# Altium footprint library SIM-Memory_Card Connectors.PcbLib: 17 footprints (part 2 of 2)
Each footprint in its own frame and in the unit in brackets; x right, y up, seen from the top. Pads: shape width x height; smd on the part's side, far side on the other; paste and mask are expansions set on the pad; w line width, h text height; cw(c..) or ccw(c..) is an arc to the next point about the centre after c.
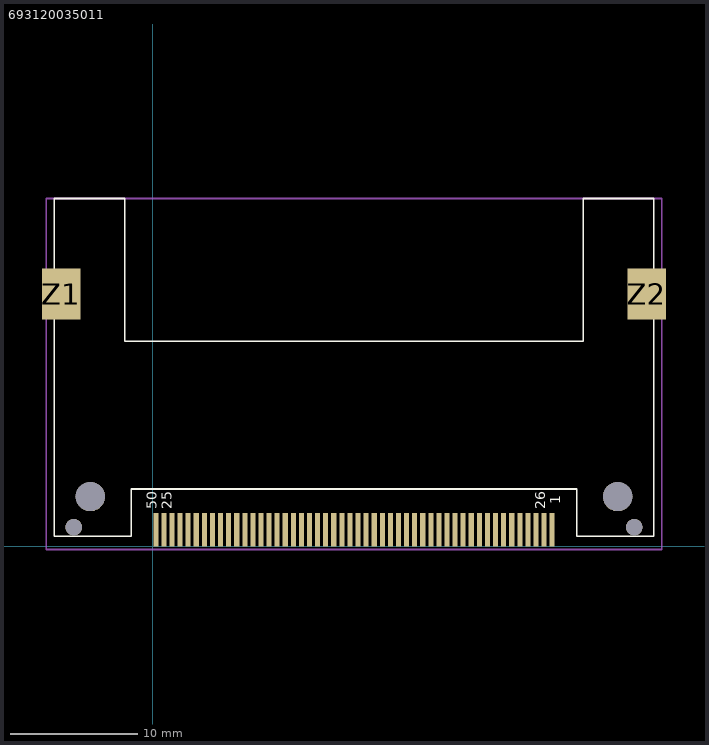
[diagram p1: the footprint, top view; thin cyan lines are the x and y axes]

## 693120035011 [mm] "WR-CRD Compact Flash_Shrouded _50 pins"
height 6.8
pads (56):
  rect 0.4x2.6 smd: 1(31.36,1.3) 2(30.09,1.3) 3(28.82,1.3) 4(27.55,1.3) 5(26.28,1.3) 6(25.01,1.3) 7(23.74,1.3) 8(22.47,1.3) 9(21.2,1.3) 10(19.93,1.3) 11(18.66,1.3) 12(17.39,1.3) 13(16.12,1.3) 14(14.85,1.3) 15(13.58,1.3) 16(12.31,1.3) 17(11.04,1.3) 18(9.77,1.3) 19(8.5,1.3) 20(7.23,1.3) 21(5.96,1.3) 22(4.69,1.3) 23(3.42,1.3) 24(2.15,1.3) 25(0.88,1.3) 26(30.725,1.3) 27(29.455,1.3) 28(28.185,1.3) 29(26.915,1.3) 30(25.645,1.3) 31(24.375,1.3) 32(23.105,1.3) 33(21.835,1.3) 34(20.565,1.3) 35(19.295,1.3) 36(18.025,1.3) 37(16.755,1.3) 38(15.485,1.3) 39(14.215,1.3) 40(12.945,1.3) 41(11.675,1.3) 42(10.405,1.3) 43(9.135,1.3) 44(7.865,1.3) 45(6.595,1.3) 46(5.325,1.3) 47(4.055,1.3) 48(2.785,1.3) 49(1.515,1.3) 50(0.245,1.3)
  rect 3x4 smd: Z1(-7.178,19.8) Z2(38.782,19.8)
  round 1.3 hole 1.3 unplated: ""(-6.2,1.5) ""(37.8,1.5)
  round 2.3 hole 2.3 unplated: ""(-4.9,3.9) ""(36.5,3.9)
Top Overlay:
  lines w0.127: -7.735,0.8 -7.735,27.3 -2.2,27.3 -2.2,16.1 33.8,16.1 33.8,27.3 39.34,27.3 39.34,0.8 33.302,0.8 33.302,4.5 -1.698,4.5 -1.698,0.8 -7.735,0.8
  text "25" at 1.5,2.9 h0.8
  text "26" at 30.8,2.9 h0.8
  text "50" at 0.3,2.9 h0.8
  text "1" at 32,3.3 h0.8
Mechanical 15:
  lines w0.127: -8.347,-0.25 -8.347,27.3 39.953,27.3 39.953,-0.25 -8.347,-0.25
3D body: height 6.8, standoff -0.6, extent -8.347,0.5 39.953,27.3